# Altium footprint library bethu.PcbLib: 628 footprints (part 27 of 40)
Each footprint in its own frame and in the unit in brackets; x right, y up, seen from the top. Pads: shape width x height; smd on the part's side, far side on the other; paste and mask are expansions set on the pad; w line width, h text height; cw(c..) or ccw(c..) is an arc to the next point about the centre after c.
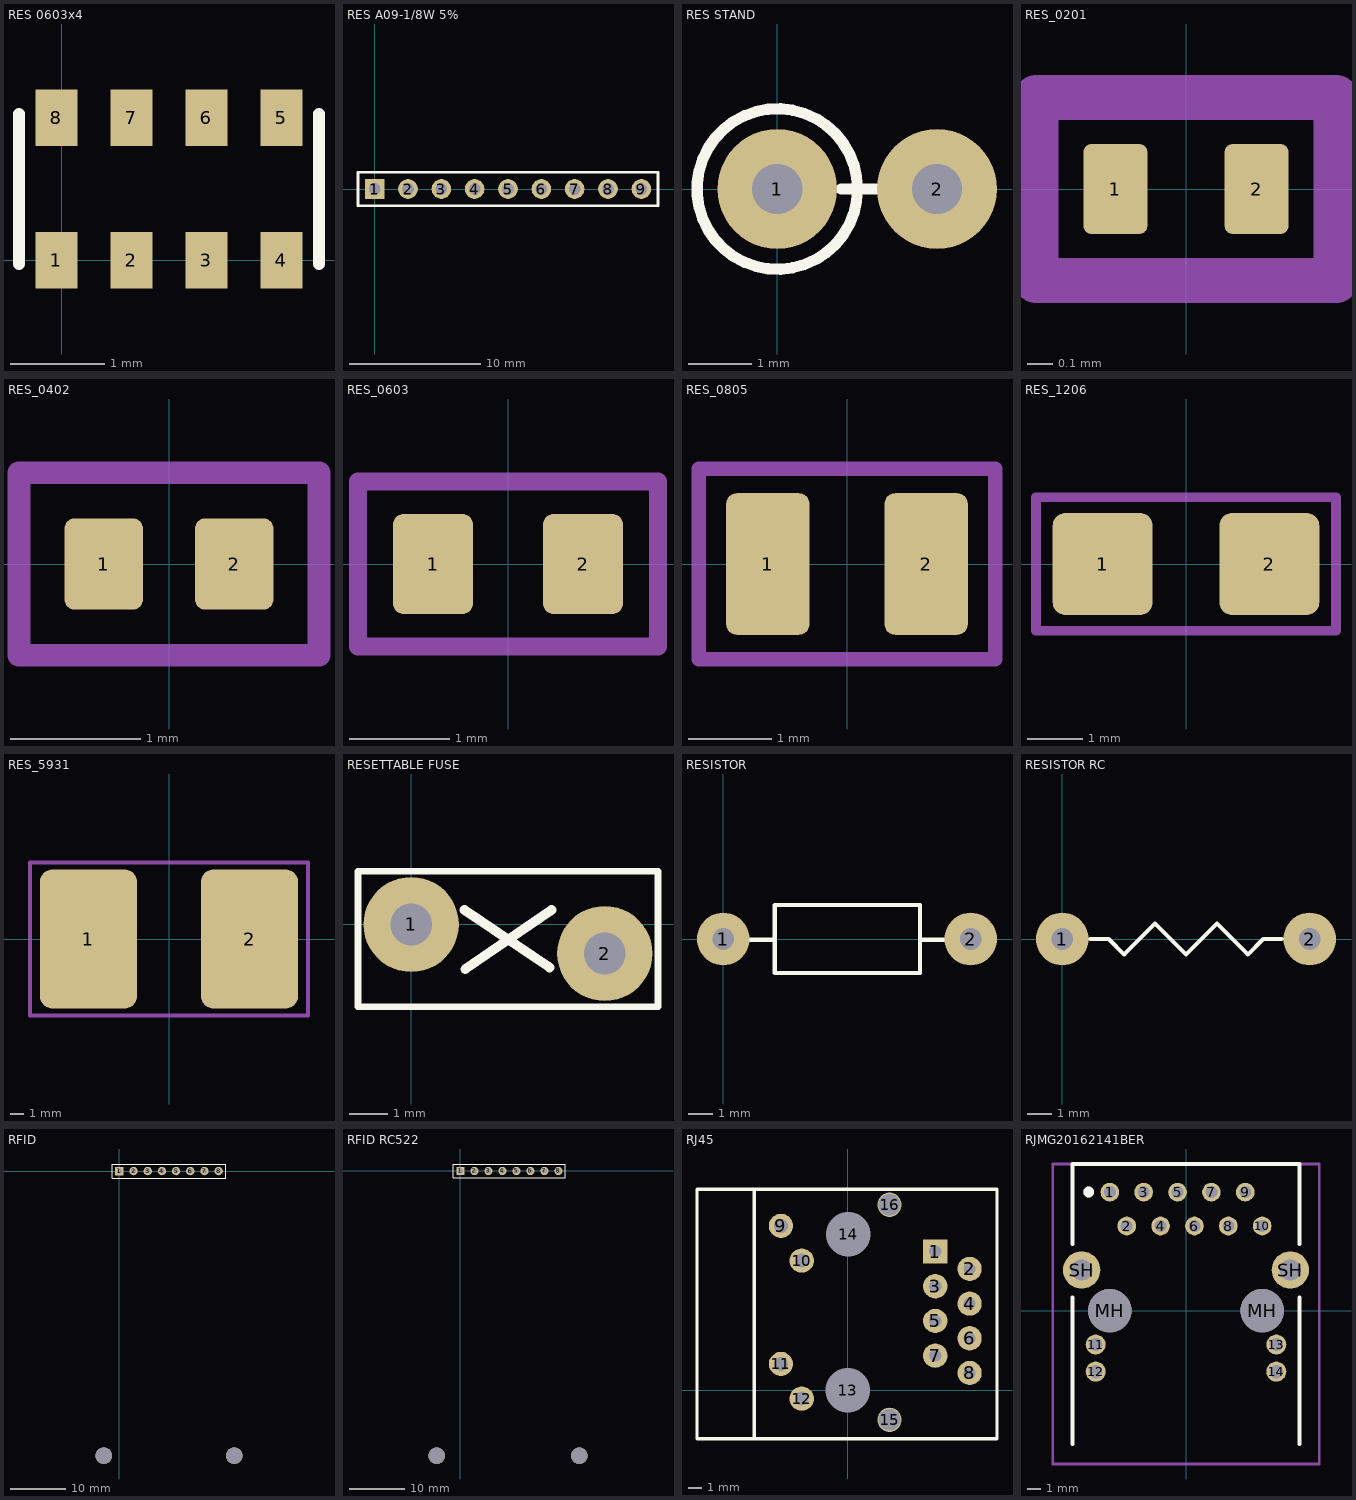
[diagram p26: the footprints below, top view; thin cyan lines are the x and y axes]

## RES 0603x4 [mm]
pads (8):
  rect 0.45x0.6 smd: 1(-0.057,0) 2(0.743,0) 3(1.543,0) 4(2.343,0) 5(2.343,1.52) 6(1.543,1.52) 7(0.743,1.52) 8(-0.057,1.52)
Top Overlay:
  lines w0.127: -0.457,-0.038 -0.457,1.562 ; 2.743,-0.038 2.743,1.562
3D body "User Library-R-0603-Array-4-1.STEP": height 0.5, standoff -0.02, extent -0.457,-0.038 2.743,1.562

## RES A09-1/8W 5% [mm]
pads (9):
  rect 1.5x1.5 hole 0.9: 1(0,0)
  round 1.5 hole 0.9: 2(2.54,0) 3(5.08,0) 4(7.62,0) 5(10.16,0) 6(12.7,0) 7(15.24,0) 8(17.78,0) 9(20.32,0)
Top Overlay:
  lines w0.2: -1.27,-1.27 -1.27,1.27 21.59,1.27 21.59,-1.27 -1.27,-1.27
3D body "User-Library-Resistor-Pack-8.STEP": height 6.43, standoff -2, extent -1.25,-1.25 21.56,1.25

## RES STAND [mm]
pads (2):
  round 1.905 hole 0.8: 1(0,0) 2(2.54,0)
Top Overlay:
  circle w0.178: c0,0 r1.276
  lines w0.178: 1.016,0 1.651,0
3D body "SW3dPS-Res_Stand.STEP": height 7.3, standoff -1.45, extent -0.889,-0.92 2.823,0.92

## RES_0201 [mm]
pads (2):
  rrect25% 0.25x0.35 smd mask+0.05: 1(-0.275,0) 2(0.275,0)
Mechanical 13:
  lines w0.175: -0.584,-0.356 -0.584,0.356 0.584,0.356 0.584,-0.356 -0.584,-0.356
  text "'.Designator'" at -5.665,-0.417 h1
3D body "R0201.step": height 0.15, standoff 0, extent -0.3,-0.15 0.3,0.15

## RES_0402 [mm]
pads (2):
  rrect25% 0.6x0.7 smd: 1(-0.5,0) 2(0.5,0)
Mechanical 13:
  lines w0.175: -1.15,-0.7 1.15,-0.7 1.15,0.7 -1.15,0.7 -1.15,-0.7
  text "'.Designator'" at -5.665,-0.417 h1
3D body "R0402.step": height 0.3, standoff 0, extent -0.5,-0.25 0.5,0.25

## RES_0603 [mm]
pads (2):
  rrect25% 0.8x1 smd: 1(-0.75,0) 2(0.75,0)
Mechanical 13:
  lines w0.175: -1.5,-0.825 1.5,-0.825 1.5,0.825 -1.5,0.825 -1.5,-0.825
  text "'.Designator'" at -5.665,-0.417 h1
3D body "R0603.step": height 0.52, standoff 0.01, extent -0.8,-0.43 0.8,0.43

## RES_0805 [mm]
pads (2):
  rrect25% 1x1.7 smd: 1(-0.95,0) 2(0.95,0)
Mechanical 13:
  lines w0.175: -1.778,-1.143 -1.778,1.143 1.778,1.143 1.778,-1.143 -1.778,-1.143
  text "'.Designator'" at -5.665,-0.417 h1
3D body "R0805.step": height 0.47, standoff 0.01, extent -1,-0.63 1,0.63

## RES_1206 [mm]
pads (2):
  rrect25% 1.8x1.84 smd: 1(-1.5,0) 2(1.5,0)
Mechanical 13:
  lines w0.175: -2.7,-1.2 -2.7,1.2 2.7,1.2 2.7,-1.2 -2.7,-1.2
  text "'.Designator'" at -5.665,-0.417 h1
3D body "R1206.step": height 0.57, standoff 0.01, extent -1.6,-0.83 1.6,0.83

## RES_5931 [mm]
pads (2):
  rrect25% 7x10 smd: 1(-5.8,0) 2(5.8,0)
Mechanical 13:
  lines w0.3: -10,-5.5 -10,0.5 -10,5.5 10,5.5 10,-5.5 -10,-5.5
  text "'.Designator'" at -5.815,-0.9 h1
3D body "WSLP5931.stp": height 1.92, standoff 0, extent -7.5,-3.875 7.5,3.875

## RESETTABLE FUSE [mm]
pads (2):
  round 2.5 hole 1.1: 1(0,0) 2(5.08,-0.762)
Top Overlay:
  lines w0.178: -1.397,-2.159 6.477,-2.159 6.477,1.397 -1.397,1.397 -1.397,-2.159
  lines w0.254: 1.397,0.381 3.632,-1.129 ; 1.417,-1.172 3.683,0.381
3D body "User Library-PTC.STEP": height 15, standoff -3.22, extent -1.16,-1.231 6.24,0.469

## RESISTOR [mil] "R 1/2W, 2 pin, 300mil"
height 100
pads (2):
  round 85 hole 35: 1(0,0) 2(400,0)
Top Overlay:
  lines w7: 42,-1 83,-1 ; 318,-1 356,-1 ; 83,-55 318,-55 318,55 83,55 83,-55
3D body "SW3dPS-AXIAL_RESISTOR(0.25W).STEP": height 91.42, standoff -70, extent -11.6,-45.49 413.6,49

## RESISTOR RC [mil] "R 1/2W, 2 pin, 300mil"
height 100
pads (2):
  round 85 hole 35: 1(0,0) 2(400,0)
Top Overlay:
  lines w7: 45,0 75,0 100,-25 150,25 200,-25 250,25 300,-25 325,0 355,0
3D body "SW3dPS-AXIAL_RESISTOR(0.25W).STEP": height 91.42, standoff -70, extent -11.6,-45.49 413.6,49

## RFID [mm]
pads (10):
  rect 1.5x1.5 hole 0.9: 1(0,0)
  round 1.5 hole 0.9: 2(2.54,0) 3(5.08,0) 4(7.62,0) 5(10.16,0) 6(12.7,0) 7(15.24,0) 8(17.78,0)
  round 3 hole 3: ""(-2.8,-51) ""(20.58,-51)
Top Overlay:
  lines w0.2: -1.27,-1.27 19.05,-1.27 19.05,1.27 -1.27,1.27 -1.27,-1.27
3D body: height 1.5, standoff 0, extent 8.89,-1.27 11.43,1.27
3D body: height 3, standoff -5, extent 9.754,-0.406 10.55,0.392
3D body: height 1.5, standoff 0, extent 6.35,-1.27 8.89,1.27
3D body: height 3, standoff -5, extent 7.214,-0.406 8.01,0.392
3D body: height 1.5, standoff 0, extent 3.81,-1.27 6.35,1.27
3D body: height 3, standoff -5, extent 4.674,-0.406 5.47,0.392
3D body: height 1.5, standoff 0, extent 1.27,-1.27 3.81,1.27
3D body: height 3, standoff -5, extent 2.134,-0.406 2.93,0.392
3D body: height 1.5, standoff 0, extent -1.27,-1.27 1.27,1.27
3D body: height 3, standoff -5, extent -0.406,-0.406 0.39,0.392
3D body: height 1.5, standoff 0, extent 16.51,-1.27 19.05,1.27
3D body: height 3, standoff -5, extent 17.374,-0.406 18.17,0.392
3D body: height 1.5, standoff 0, extent 13.97,-1.27 16.51,1.27
3D body: height 3, standoff -5, extent 14.834,-0.406 15.63,0.392
3D body: height 1.5, standoff 0, extent 11.43,-1.27 13.97,1.27
3D body: height 3, standoff -5, extent 12.294,-0.406 13.09,0.392
3D body "n.step": height 3.5, standoff -5, extent -11.364,-58.73 28.636,1.27

## RFID RC522 [mm]
pads (10):
  rect 1.5x1.5 hole 0.9: 1(0,0)
  round 1.5 hole 0.9: 2(2.54,0) 3(5.08,0) 4(7.62,0) 5(10.16,0) 6(12.7,0) 7(15.24,0) 8(17.78,0)
  round 3 hole 3: ""(-4.318,-51.689) ""(21.59,-51.689)
Top Overlay:
  lines w0.2: -1.27,-1.27 19.05,-1.27 19.05,1.27 -1.27,1.27 -1.27,-1.27
3D body "User Library-Header_Male_8Pin.STEP": height 9, standoff -2.54, extent -1.27,-1.245 19.05,1.245
3D body "RFID-?????? 13.56 ???.STEP": height 10.9, standoff 6, extent -11.364,-58.73 28.636,1.27

## RJ45 [mil]
pads (16):
  rect 70x70 hole 35.04 unplated: 1(252,400)
  round 70 hole 35.04 unplated: 2(351,350) 3(252,300) 4(351,250) 5(252,200) 6(351,150) 7(252,100) 8(351,50)
  round 70 hole 40.16 unplated: 9(-192.91,474.02) 10(-133.07,374.02) 11(-192.91,75.98) 12(-133.07,-24.02)
  round 70 hole 127.95 unplated: 13(0,0) 14(1,450)
  round 70 hole 62.99 unplated: 15(120.08,-85.04) 16(120.08,535.04)
Top Overlay:
  lines w10: -270,-140 -270,580 ; -435,-140 430,-140 430,580 -435,580 -435,-130 -435,-140
3D body "User Library-RMS-001L-08A0-GY.STEP": height 511.81, standoff -149.61, extent -418.58,-94.96 420,534.96

## RJMG20162141BER [mm]
height 13.9
pads (18):
  round 1.4 hole 0.9: 1(-5.715,8.89) 2(-4.445,6.35) 3(-3.175,8.89) 4(-1.905,6.35) 5(-0.635,8.89) 6(0.635,6.35) 7(1.905,8.89) 8(3.175,6.35) 9(4.445,8.89) 10(5.715,6.35)
  round 1.5 hole 1: 11(-6.775,-2.54) 12(-6.775,-4.57) 13(6.775,-2.54) 14(6.775,-4.57)
  round 3.25 hole 3.25 unplated: MH(-5.715,0) MH(5.715,0)
  round 2.8 hole 1.6: SH(-7.825,3.05) SH(7.825,3.05)
Top Overlay:
  circle w0.4: c-7.3,8.9 r0.2
  lines w0.3: -8.5,-10 -8.5,1 ; -8.5,5 -8.5,11 8.5,11 8.5,5 ; 8.5,-10 8.5,1
Mechanical 13:
  circle w0.4: c-7.3,8.9 r0.2
  lines w0.2: -10,-11.5 -10,11 10,11 10,-11.5 -10,-11.5
  text "'.Designator'" at -5.665,-0.417 h1
3D body "RJMG20162141BER.STEP": height 14.87, standoff -3.31, extent -8.722,-11.075 8.721,10.57